# Altium integrated library Misc.IntLib: 123 symbols
Pins are listed as number, name and electrical type; pins without a type are passive.

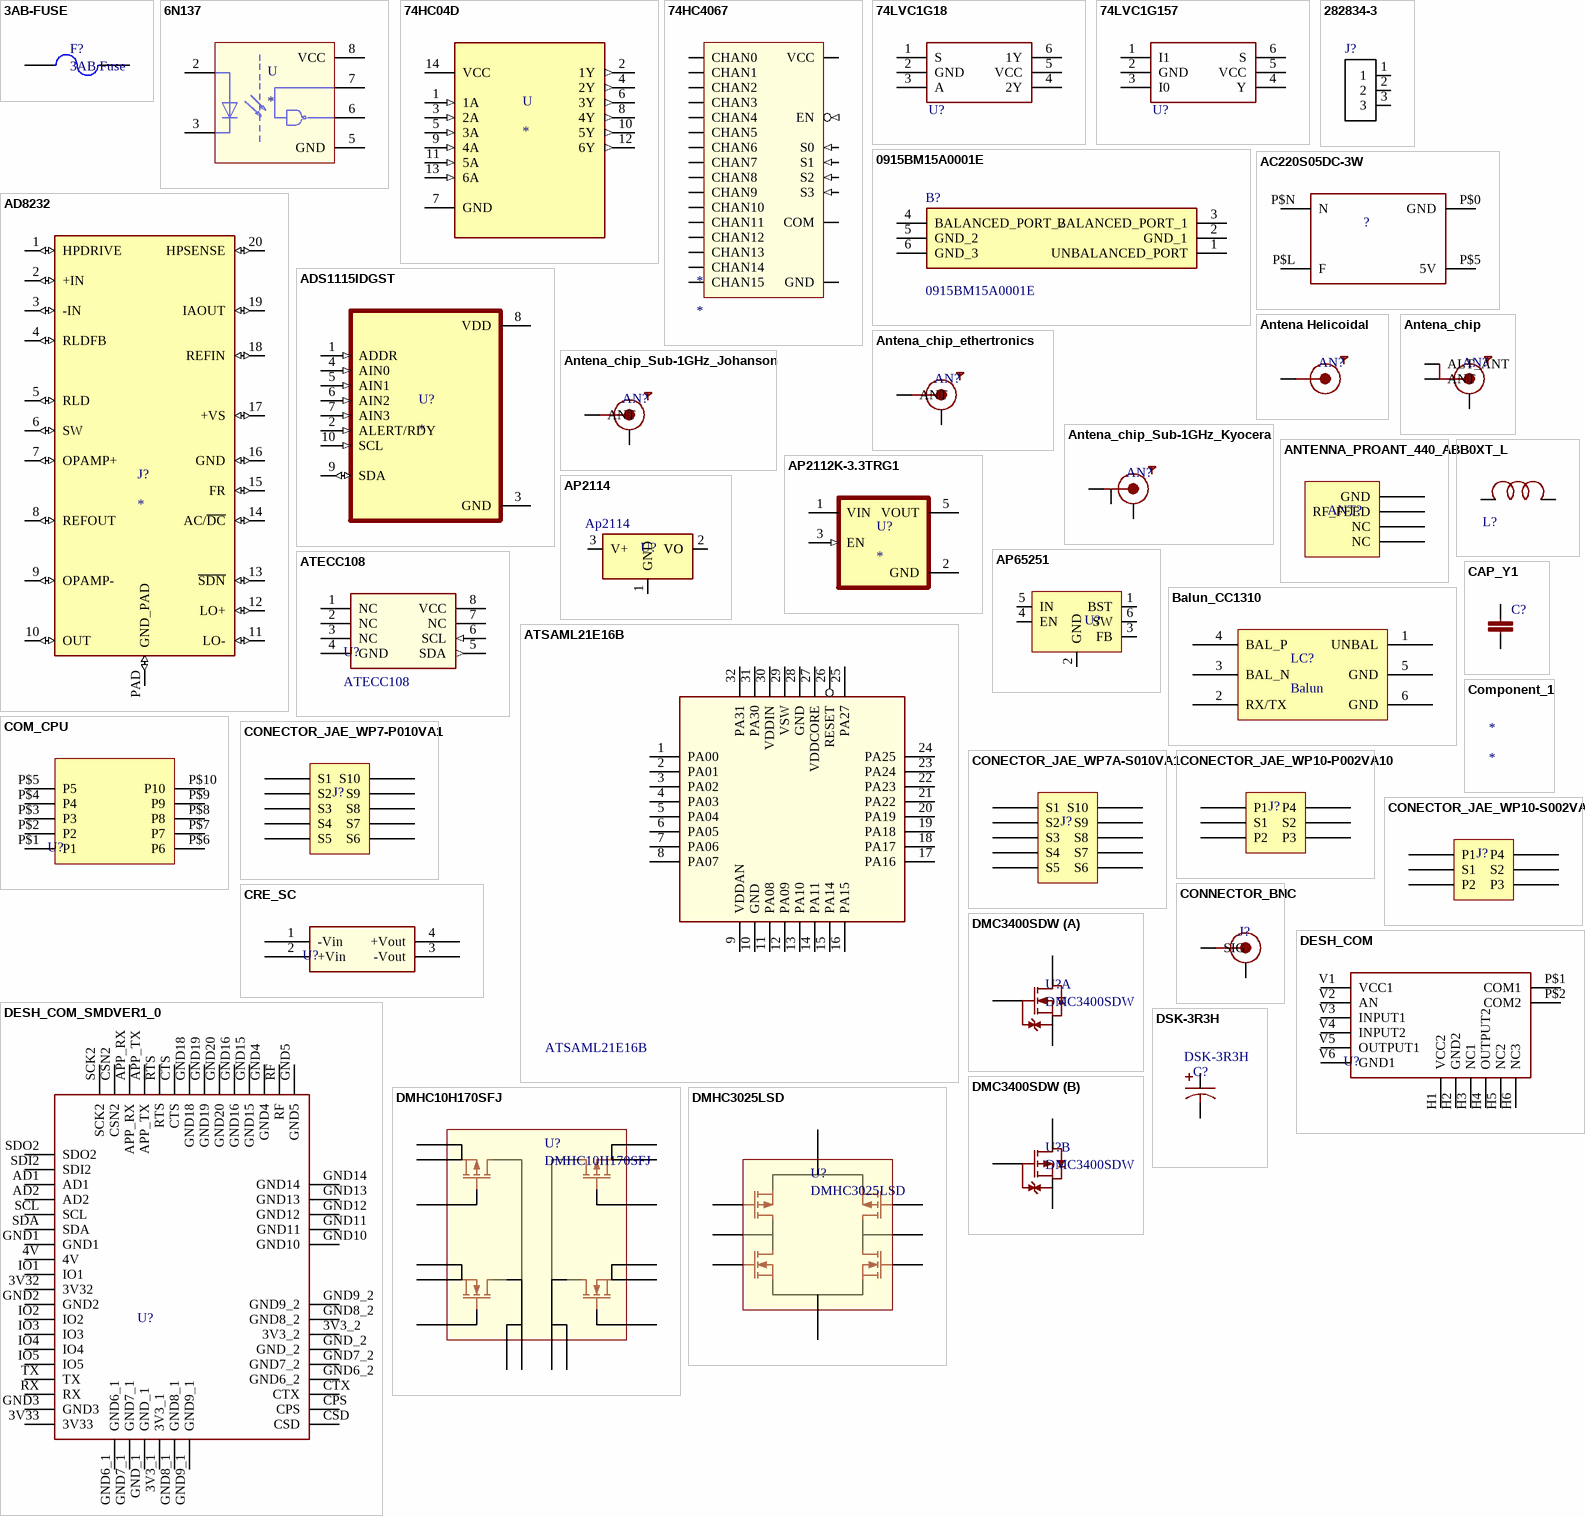
[diagram p0: symbols 3AB-FUSE to DSK-3R3H]

## 3AB-FUSE
designator F?, comment 3AB Fuse
footprint 3AB FUSE
pins: 1, 2

## 6N137
designator U
Optoaislador de salida lÃ³gica 10Mbps Open Collector 5000Vrms 1 Channel 5kV / Âµs CMTI 8-DIP; MP: 6N137; MF: Everlight Electronics; Availability: Unavailable; Package: DIP-8 Broadcom; Value: *; Price: None; SnapEDA_Link: https://www.snapeda.com/parts/6N137/Everlight%20Electronics%20Co%20Ltd/view-part/1771557/?ref=snap
footprint DIP8
pins: 2 A, 3 C, 5 GND (power), 6 VO, 7 VE, 8 VCC (power)

## 74HC04D
designator U
Inverter IC 6 Channel 14-SOIC; MP: 74HC04D; MF: Toshiba; Value: *; Package: SOIC-14 NXP Semiconductors; Price: None; Availability: Unavailable; SnapEDA_Link: https://www.snapeda.com/parts/74HC04D/Toshiba%20Semiconductor%20and%20Storage/view-part/1040011/?ref=snap
footprint SOIC14N
pins: 1 1A (in), 2 1Y (out), 3 2A (in), 4 2Y (out), 5 3A (in), 6 3Y (out), 7 GND, 8 4Y (out), 9 4A (in), 10 5Y (out), 11 5A (in), 12 6Y (out), 13 6A (in), 14 VCC (power)

## 74HC4067
designator *
footprint SOIC24
footprint DIP24
pins: 1 COM (io), 2 CHAN7 (io), 3 CHAN6 (io), 4 CHAN5 (io), 5 CHAN4 (io), 6 CHAN3 (io), 7 CHAN2 (io), 8 CHAN1 (io), 9 CHAN0 (io), 10 S0 (in), 11 S1 (in), 12 GND (io), 13 S3 (in), 14 S2 (in), 15 EN (in), 16 CHAN15 (io), 17 CHAN14 (io), 18 CHAN13 (io), 19 CHAN12 (io), 20 CHAN11 (io), 21 CHAN10 (io), 22 CHAN9 (io), 23 CHAN8 (io), 24 VCC (io)

## 74LVC1G18
designator U?
footprint SOT-353
pins: 1 S, 2 GND, 3 A, 4 2Y, 5 VCC, 6 1Y

## 74LVC1G157
designator U?
pins: 1 I1, 2 GND, 3 I0, 4 Y, 5 VCC, 6 S

## 0915BM15A0001E
designator B?
Signal Conditioning 915MHz BALUN/FILTER; Manufacturer_Name: JOHANSON TECHNOLOGY; Geometry.Height: 0.8mm; Mouser Part Number: 609-0915BM15A0001E; Mouser Price/Stock: https://www.mouser.co.uk/ProductDetail/Johanson-Technology/0915BM15A0001E?qs=yCnrNFeXz%252BhK%252B21mdTuojA%3D%3D; Manufacturer_Part_Number: 0915BM15A0001E; Datasheet Link: *
footprint 0915BM15A0001E
pins: 1 UNBALANCED_PORT, 2 GND_1, 3 BALANCED_PORT_1, 4 BALANCED_PORT_2, 5 GND_2, 6 GND_3

## 282834-3
designator J?  (value not drawn)
3 Position Wire to Board Terminal Block Horizontal with Board 0.100 _2.54mm_; MF: TE Connectivity; Package: None; SnapEDA_Link: https://www.snapeda.com/parts/282834-3/TE%20Connectivity%20AMP%20Connectors/view-part/?ref=snap; MP: 282834-3; Availability: Unavailable; TE_purchase_URL: https://www.te.com/usa-en/product-282834-3.html?te_bu=Cor&te_type=disp&te_campaign=seda_glo_cor-seda-global-disp-prtnr-fy19-seda-model-bom-cta_sma-317_1&elqCampaignId=32493; Price: None; EU_RoHS_Compliance: Compliant with Exemptions; Value: *
footprint TE_282834-3
pins: 1, 2, 3

## AC220S05DC-3W
designator ?
footprint HENLV
pins: P$0 GND, P$5 5V, P$L F, P$N N

## AD8232
designator J?
AD8232 Analog Front End Evaluation Board; MF: Analog Devices, Inc.; SnapEDA_Link: https://www.snapeda.com/parts/AD8232/Analog+Devices/view-part/?ref=snap; Package: None; Value: *; MP: AD8232; Check_prices: https://www.snapeda.com/parts/AD8232/Analog+Devices/view-part/?ref=eda
footprint LFCSP_20
pins: 1 HPDRIVE (io), 2 +IN (io), 3 -IN (io), 4 RLDFB (io), 5 RLD (io), 6 SW (io), 7 OPAMP+ (io), 8 REFOUT (io), 9 OPAMP- (io), 10 OUT (io), 11 LO- (io), 12 LO+ (io), 13 ~{SDN} (io), 14 AC/~{DC} (io), 15 FR (io), 16 GND (io), 17 +VS (io), 18 REFIN (io), 19 IAOUT (io), 20 HPSENSE (io), PAD GND_PAD (io)

## ADS1115IDGST
designator U?
MP: ADS1115IDGST; Value: *; Price: None; Package: None; Availability: Unavailable
footprint SOP50P490X110-10N
pins: 1 ADDR (in), 2 ALERT/RDY (in), 3 GND (power), 4 AIN0 (in), 5 AIN1 (in), 6 AIN2 (in), 7 AIN3 (in), 8 VDD (power), 9 SDA (io), 10 SCL (in)

## Antena Helicoidal
designator AN?, comment Antenna  (value not drawn)
antenna helicoidal Sub-1GHZ; Value: 915MHz
footprint Antena Sub-1GHz horizon
footprint Antena Sub-1GHz vertical
footprint Antena Sub-1GHz horizon - Longo
pins: 1 ANT

## Antena_chip
designator AN?, comment Antenna Chip  (value not drawn)
Molex antenna chip for 2.4GHZ; Part Number: 2030060001; Value: 2.4GHz; Vendor: Molex
footprint Antenna_molex_203 (Wi-Fi-ready MID Chip  and Ceramic SMT Antennas)
pins: 1 ALT_ANT, 2 ANT, 3 GND (power)

## Antena_chip_ethertronics
designator AN?, comment Antenna Chip  (value not drawn)
Molex antenna chip for 2.4GHZ; Part Number: M310220; Vendor: Ethertronics; Value: 2.4GHz
footprint Antena_ethertronics_M310220 (Antena chip Ethertronics BT e wifi)
pins: 1 ANT, 2 GND (power)

## Antena_chip_Sub-1GHz_Johanson
designator AN?, comment Antenna Chip  (value not drawn)
Antennas 915MHz ANTENNA; Part Number: 0915AT43A0026E; Vendor: Johanson Technology; Value: 915MHz
footprint Antenna_Johanson_0915AT43 (Antennas 915MHz ANTENNA)
pins: 1 ANT, 2 GND

## Antena_chip_Sub-1GHz_Kyocera
designator AN?, comment Antenna Chip  (value not drawn)
Antennas Ceramic Chip ANTENNA ISM Freq: 868 915MHz; Part Number: M620720; Value: Sub-1GHz; Vendor: AVX; Família: Antena
footprint Antena_ethertronics_M620720 (Antena chip Ethertronics Sub-1GHz)
pins: 1 FEED, 2 DUMMY, 3 GND (power)

## ANTENNA_PROANT_440_AB
designator ANT?
Small antenna for embedded products on the 2.4GHz ISM band, suitable for applications in  WLAN/Wifi, Bluetooth, Zigbee, RFID, WirelessHART etc.; Part Number: PRO-OB-440; Vendor: Proant; Value: *
footprint ANTENNA_PROANT_440_AB (Small antenna for embedded products on the 2.4GHz ISM band, suitable for applications in  WLAN/Wifi, Bluetooth, Zigbee, RFID, WirelessHART etc.)
pins: 1 GND, 2 RF_FEED, 3 NC, 4 NC

## AP2112K-3.3TRG1
designator U?
Linear Voltage Regulator IC Positive Fixed 1 Output 600mA SOT-25; MF: Diodes Inc.; MP: AP2112K-3.3TRG1; Value: *; Purchase-URL: https://pricing.snapeda.com/search/part/AP2112K-3.3TRG1/?ref=eda; Package: SOT-753 Diodes Inc.; Availability: In Stock; Check_prices: https://www.snapeda.com/parts/AP2112K-3.3TRG1/Diodes+Inc./view-part/?ref=eda; Price: None; SnapEDA_Link: https://www.snapeda.com/parts/AP2112K-3.3TRG1/Diodes+Inc./view-part/?ref=snap
footprint SOT95P285X140-5N
pins: 1 VIN (power), 2 GND (power), 3 EN (in), 5 VOUT (power)

## AP2114
designator U?
Vendor: Diodes Incorporated; Part Number: Ap2114
footprint SOT223 (SOT223, 4-Leads)
pins: 1 GND (power), 2 VO, 3 V+ (power), 4 VO

## AP65251
designator U?  (value not drawn)
Part Number: AP65251WU-7; Vendor: Diodes Inc.
footprint DBV0006A_N
pins: 1 BST (power), 2 GND, 3 FB, 4 EN, 5 IN, 6 SW

## ATECC108
designator U?
Atmel CryptoAuthentication Device; Part Number: ATMEL ATECC108; Value: ATECC108
footprint UDFN8 (UDFN8 2x3, 0.65P  CASE 517BF)
pins: 1 NC, 2 NC, 3 NC, 4 GND (power), 5 SDA (out), 6 SCL (in), 7 NC, 8 VCC (power)

## ATSAML21E16B
designator U?
Ultra low-power microcontroller using the 32-bit ARM Cortex- M0+ processor at max; Vendor: Microchip; Part Number: ATSAML21E16B
footprint TQFP32
pins: 1 PA00, 2 PA01, 3 PA02, 4 PA03, 5 PA04, 6 PA05, 7 PA06, 8 PA07, 9 VDDAN, 10 GND, 11 PA08, 12 PA09, 13 PA10, 14 PA11, 15 PA14, 16 PA15, 17 PA16, 18 PA17, 19 PA18, 20 PA19, 21 PA22, 22 PA23, 23 PA24, 24 PA25, 25 PA27, 26 RESET, 27 VDDCORE, 28 GND, 29 VSW, 30 VDDIN, 31 PA30, 32 PA31

## B0XT_L
designator L?
footprint IND_B0X
pins: P$1 P1, P$2 P2

## Balun_CC1310
designator LC?, comment Balun
Sub-GHz Impedance Matched Balun + LPF integrated Passive Component for Texas Instruments CC1310 Chipset; Part Number: 0850BM14E0016; Vendor: Johanson Technology; Value: *
footprint Balun_0603 (SMD Balun 0603)
pins: 1 UNBAL, 2 RX/TX, 3 BAL_N, 4 BAL_P, 5 GND, 6 GND

## CAP_Y1
designator C?
footprint Y1
pins: 1, 2

## COM_CPU
designator U?
footprint COM_CPU
pins: P$1 P1, P$2 P2, P$3 P3, P$4 P4, P$5 P5, P$6 P6, P$7 P7, P$8 P8, P$9 P9, P$10 P10

## Component_1
designator *

## CONECTOR_JAE_WP7-P010VA1
designator J?
WP7-P010VA1 - plug - (10 signal); Part Number: WP7-P010VA1-R8000; Value: *; Vendor: *
footprint WP7-P010VA1
pins: 1 S1, 2 S2, 3 S3, 4 S4, 5 S5, 6 S6, 7 S7, 8 S8, 9 S9, 10 S10

## CONECTOR_JAE_WP7A-S010VA1
designator J?
WP7A-S010VA1 - recpt. - (10 signal); Part Number: WP7A-S010VA1-R8000; Value: *; Vendor: *
footprint WP7A-S010VA1
pins: 1 S1, 2 S2, 3 S3, 4 S4, 5 S5, 6 S6, 7 S7, 8 S8, 9 S9, 10 S10

## CONECTOR_JAE_WP10-P002VA10
designator J?
WP10-P002VA10 - plug - (2 signal + 4 power); Part Number: WP10-P002VA10-R15000; Value: *; Vendor: *
footprint WP10-P002VA10
pins: 1 P1, 2 S1, 3 P2, 4 P3, 5 S2, 6 P4

## CONECTOR_JAE_WP10-S002VA10
designator J?
WP10-S002VA10 - recpt. - (2 signal + 4 power); Part Number: WP10-S002VA10-R15000; Value: *; Vendor: *
footprint WP10-S002VA10
pins: 1 P1, 2 S1, 3 P2, 4 P3, 5 S2, 6 P4

## CONNECTOR_BNC
designator J?
footprint CONNECTOR_BNC
pins: 1 SIG, 2 GND (power)

## CRE_SC
designator U?  (value not drawn)
footprint CRE1-SC (DC_DC isolated converter)
pins: 1 -Vin, 2 +Vin, 3 -Vout, 4 +Vout

## DESH_COM
designator U?
footprint DESH_COM
pins: H1 VCC2 (power), H2 GND2, H3 NC1, H4 OUTPUT2, H5 NC2, H6 NC3, P$1 COM1, P$2 COM2, V1 VCC1 (power), V2 AN, V3 INPUT1, V4 INPUT2, V5 OUTPUT1, V6 GND1

## DESH_COM_SMDVER1_0
designator U?  (value not drawn)
footprint DESH_COM_SMD
pins: 3V3_1, 3V3_2, 3V32, 3V33, 4V, AD1, AD2, APP_RX, APP_TX, CPS, CSD, CSN2, CTS, CTX, GND1, GND2, GND3, GND4, GND5, GND6_1, GND6_2, GND7_1, GND7_2, GND8_1, GND8_2, GND9_1, GND9_2, GND10, GND11, GND12, GND13, GND14, GND15, GND16, GND18, GND19, GND20, GND_1, GND_2, IO1, IO2, IO3, IO4, IO5, RF, RTS, RX, SCK2, SCL, SDA, SDI2, SDO2, TX

## DMC3400SDW
designator U?
COMPLEMENTARY PAIR ENHANCEMENT MODE MOSFET; Part Number: DMC3400SDW-13; Vendor: Diodes Incorporated
footprint SOT363
part A pins: 1 S1, 2 G1, 6 D1
part B pins: 3 D2, 4 S2, 5 G2

## DMHC10H170SFJ
designator U?
100V COMPLEMENTARY ENHANCEMENT MODE MOSFET H-BRIDGE; Vendor: Diodes Incorporated
pins: 1 G1, 2 S1, 3 S1, 4 G2, 5 S2, 6 S2, 7 S3, 8 S3, 9 G3, 10 S4, 11 S4, 12 G4, B1 D1_2, B2 D1_2, B3 D3_4, B4 D3_4

## DMHC3025LSD
designator U?
30V COMPLEMENTARY ENHANCEMENT MODE MOSFET H-BRIDGE; Vendor: Diodes Incorporated; Part Number: DMHC3025LSD
footprint SO08-MEDIUM
pins: 1 N1G, 2 N1D/P1D, 3 N1S/N2S, 4 N2G, 5 P2G, 6 N2D/P2D, 7 P1S/P2S, 8 P1G

## DSK-3R3H
designator C?  Part Number: DSK-3R3H
Coin Cell Capacitors, Elne; Vendor: Elna; Família: Capacitor
footprint DSK-3R3H204T614-H2L
pins: 1 +, 2 -

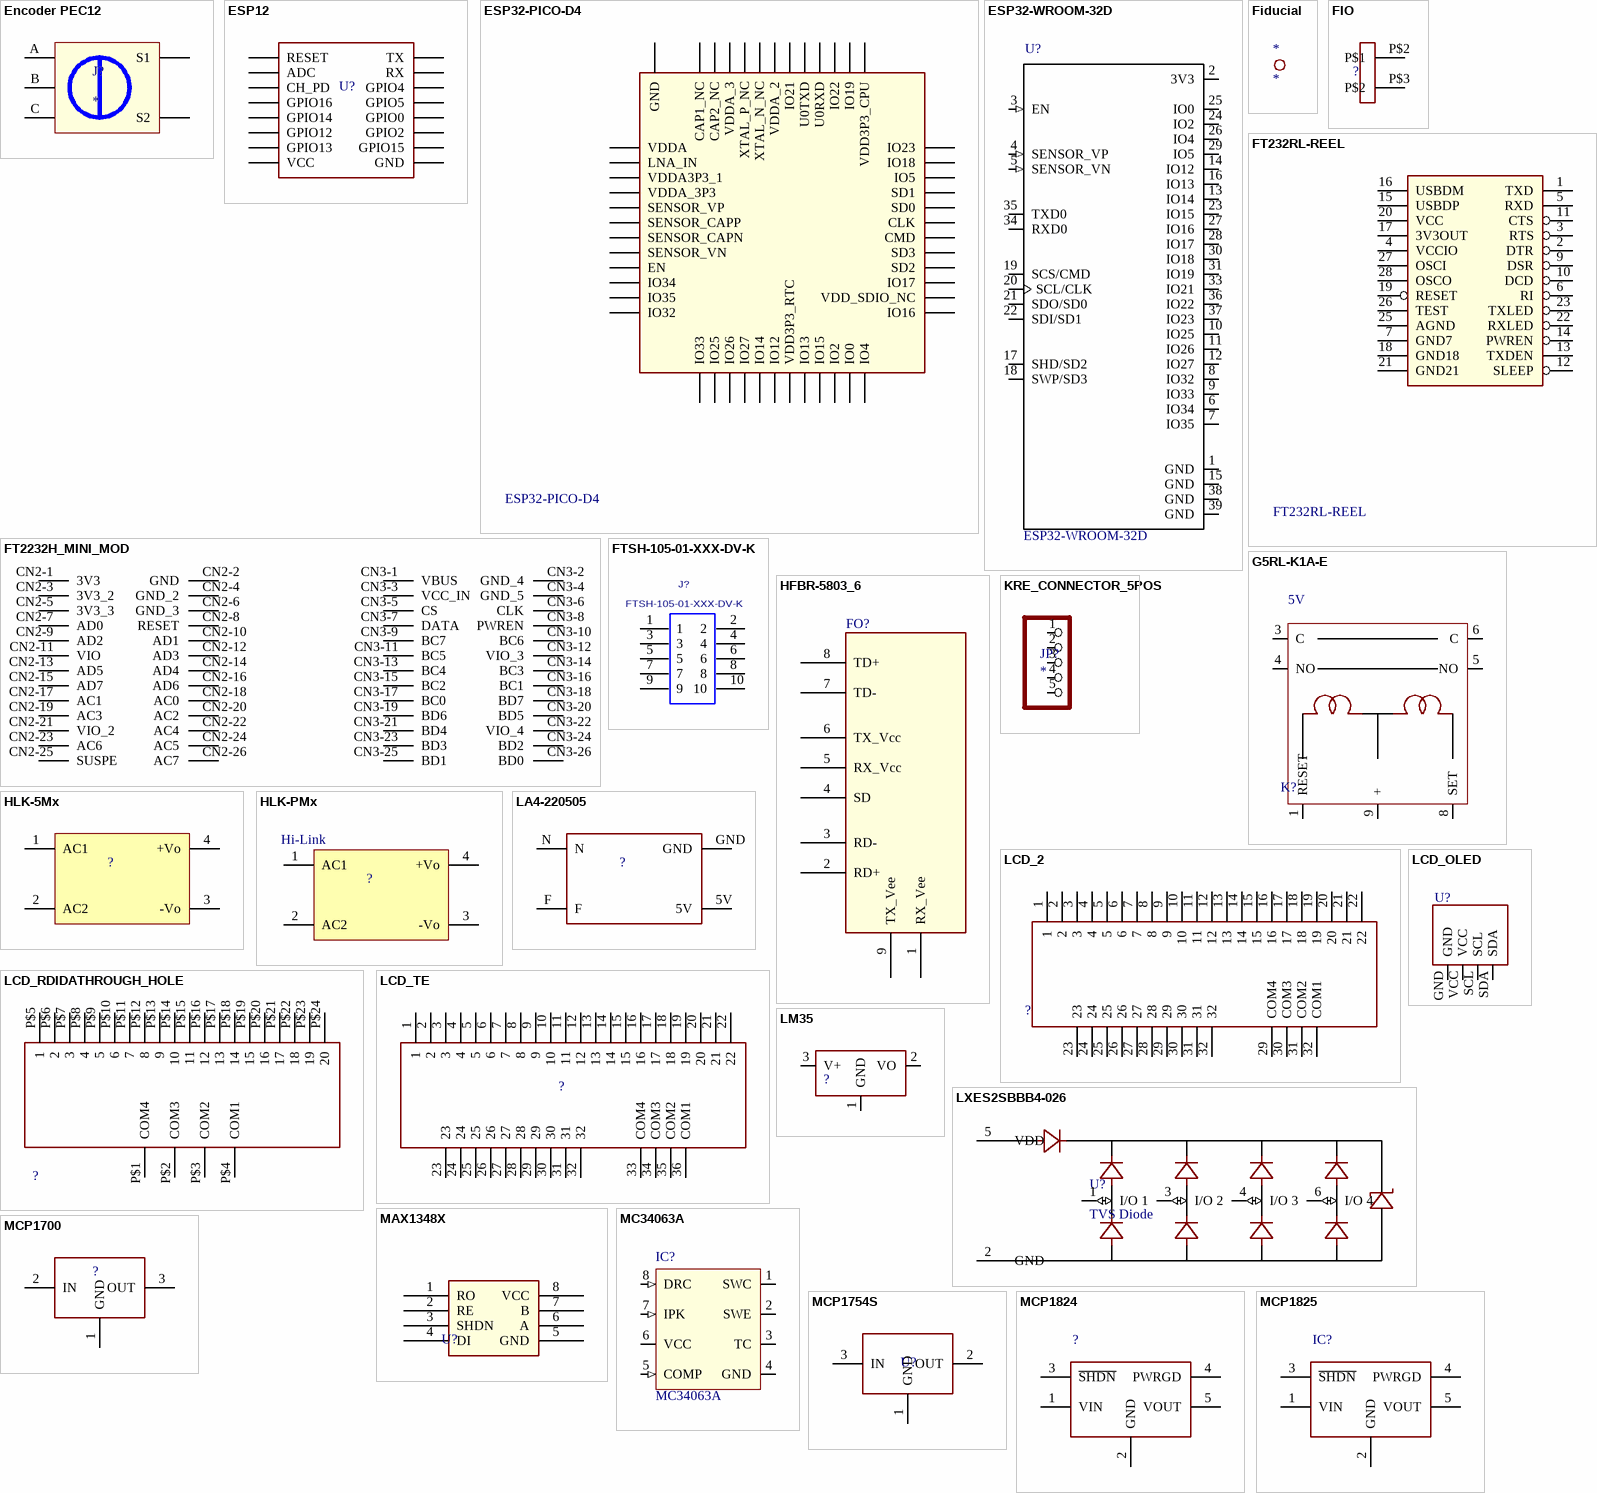
[diagram p1: symbols Encoder PEC12 to MCP1825]

## Encoder PEC12
designator J?
PEC12R-3217F-S0024
pins: 1 S1, 2 S2, A, B, C

## ESP12
designator U?  (value not drawn)
Part Number: ESP12; Vendor: AI Thinjer
footprint ESP12 (Wifi module ESP12)
pins: ADC, CH_PD, GND, GPIO0, GPIO2, GPIO4, GPIO5, GPIO12, GPIO13, GPIO14, GPIO15, GPIO16, RESET, RXD0 RX, TXD0 TX, VCC

## ESP32-PICO-D4
designator U?
System-in-Package (SIP) module based on ESP32; Vendor: Espressif; Part Number: ESP32-PICO-D4; Value: *
footprint QFN48-7x7
pins: 1 VDDA, 2 LNA_IN, 3 VDDA3P3_1, 4 VDDA_3P3, 5 SENSOR_VP, 6 SENSOR_CAPP, 7 SENSOR_CAPN (power), 8 SENSOR_VN, 9 EN, 10 IO34, 11 IO35, 12 IO32, 13 IO33, 14 IO25, 15 IO26, 16 IO27, 17 IO14, 18 IO12 (power), 19 VDD3P3_RTC, 20 IO13, 21 IO15, 22 IO2, 23 IO0, 24 IO4, 25 IO16, 26 VDD_SDIO_NC, 27 IO17, 28 SD2, 29 SD3, 30 CMD, 31 CLK, 32 SD0, 33 SD1, 34 IO5, 35 IO18, 36 IO23, 37 VDD3P3_CPU, 38 IO19, 39 IO22, 40 U0RXD, 41 U0TXD, 42 IO21 (power), 43 VDDA_2, 44 XTAL_N_NC, 45 XTAL_P_NC, 46 VDDA_3, 47 CAP2_NC, 48 CAP1_NC, 49 GND

## ESP32-WROOM-32D
designator U?
ESP32 Module; MF: Espressif Systems; MP: ESP32-WROOM-32D; SnapEDA_Link: https://www.snapeda.com/parts/ESP32-WROOM-32D/Espressif%20Systems/view-part/?ref=snap; Package: Module Espressif Systems; Digi-Key_Part_Number: 1904-1023-1-ND; Digi-Key_Purchase_URL: https://www.digikey.com/product-detail/en/espressif-systems/ESP32-WROOM-32D/1904-1023-1-ND/9381732?utm_source=snapeda&utm_medium=aggregator&utm_campaign=symbol; Value: *
footprint ESP32-WROOM-32D
pins: 1 GND (power), 2 3V3 (power), 3 EN (in), 4 SENSOR_VP (in), 5 SENSOR_VN (in), 6 IO34 (io), 7 IO35 (io), 8 IO32 (io), 9 IO33 (io), 10 IO25 (io), 11 IO26 (io), 12 IO27 (io), 13 IO14 (io), 14 IO12 (io), 15 GND (power), 16 IO13 (io), 17 SHD/SD2 (io), 18 SWP/SD3 (io), 19 SCS/CMD (io), 20 SCL/CLK (io), 21 SDO/SD0 (io), 22 SDI/SD1 (io), 23 IO15 (io), 24 IO2 (io), 25 IO0 (io), 26 IO4 (io), 27 IO16 (io), 28 IO17 (io), 29 IO5 (io), 30 IO18 (io), 31 IO19 (io), 33 IO21 (io), 34 RXD0 (io), 35 TXD0 (io), 36 IO22 (io), 37 IO23 (io), 38 GND (power), 39 GND (power)

## Fiducial
designator *
footprint Fiducial

## FIO
designator ?
footprint CONECTORFIO
pins: P$2 P$1, P$3 P$2

## FT232RL-REEL
designator U?
USB Interface IC USB to Serial UART Enhanced IC SSOP-28; Vendor: FTDI Chip; Part Number: FT232RL-REEL; Value: *
footprint FT232R
pins: 1 TXD, 2 DTR, 3 RTS, 4 VCCIO, 5 RXD, 6 RI, 7 GND7, 9 DSR, 10 DCD, 11 CTS, 12 SLEEP, 13 TXDEN, 14 PWREN, 15 USBDP, 16 USBDM, 17 3V3OUT, 18 GND18, 19 RESET, 20 VCC, 21 GND21, 22 RXLED, 23 TXLED, 25 AGND, 26 TEST, 27 OSCI, 28 OSCO

## FT2232H_MINI_MOD
designator U?  (value not drawn)
footprint FT2232_MOD
pins: CN2-1 3V3, CN2-2 GND, CN2-3 3V3_2, CN2-4 GND_2, CN2-5 3V3_3, CN2-6 GND_3, CN2-7 AD0, CN2-8 RESET, CN2-9 AD2, CN2-10 AD1, CN2-11 VIO, CN2-12 AD3, CN2-13 AD5, CN2-14 AD4, CN2-15 AD7, CN2-16 AD6, CN2-17 AC1, CN2-18 AC0, CN2-19 AC3, CN2-20 AC2, CN2-21 VIO_2, CN2-22 AC4, CN2-23 AC6, CN2-24 AC5, CN2-25 SUSPE, CN2-26 AC7, CN3-1 VBUS, CN3-2 GND_4, CN3-3 VCC_IN, CN3-4 GND_5, CN3-5 CS, CN3-6 CLK, CN3-7 DATA, CN3-8 PWREN, CN3-9 BC7, CN3-10 BC6, CN3-11 BC5, CN3-12 VIO_3, CN3-13 BC4, CN3-14 BC3, CN3-15 BC2, CN3-16 BC1, CN3-17 BC0, CN3-18 BD7, CN3-19 BD6, CN3-20 BD5, CN3-21 BD4, CN3-22 VIO_4, CN3-23 BD3, CN3-24 BD2, CN3-25 BD1, CN3-26 BD0

## FTSH-105-01-XXX-DV-K
designator J?
TERMINAL STRIP, .050"(1.27mm) PITCH, 10 PINS, KEYED
footprint FTSH-105-01-XXX-DV-K
pins: 1, 2, 3, 4, 5, 6, 7, 8, 9, 10

## G5RL-K1A-E
designator K?  value 5V
Part Number: G5RL-K1A-E
footprint OnROM RELAY LATCH 1 NO
pins: 1 RESET, 3 C, 4 NO, 5 NO, 6 C, 8 SET, 9 +

## HFBR-5803_6
designator FO?, comment AVAGO_AFBR-5803Z  (value not drawn)
FDDI, 100 Mb/s ATM, and Fast Ethernet Transceivers; Part Number: AFBR-580xxTZ; Vendor: AVAGO
footprint AVAGO_AFBR-5803Z
pins: 1 RX_Vee, 2 RD+, 3 RD-, 4 SD, 5 RX_Vcc, 6 TX_Vcc, 7 TD-, 8 TD+, 9 TX_Vee

## HLK-5Mx
designator ?  (value not drawn)
5W Power Module
footprint HLK-5MX (5W power supply)
pins: 1 AC1, 2 AC2, 3 -Vo, 4 +Vo

## HLK-PMx
designator ?  Vendor: Hi-Link  (hidden comment: HLK-PMx)
3W Power Module
footprint HLK-PMX (3W power supply)
pins: 1 AC1, 2 AC2, 3 -Vo, 4 +Vo

## KRE_CONNECTOR_5POS
designator JP?
footprint KRE_CONNECTOR_5POS (KRE Connector 5pos 1kV)
pins: 1, 2, 3, 4, 5

## LA4-220505
designator ?
footprint LA4
pins: 5V, F, GND, N

## LCD_2
designator ?
footprint LCD_2
pins: 1, 2, 3, 4, 5, 6, 7, 8, 9, 10, 11, 12, 13, 14, 15, 16, 17, 18, 19, 20, 21, 22, 23, 24, 25, 26, 27, 28, 29 COM4, 29, 30 COM3, 30, 31 COM2, 31, 32 COM1, 32

## LCD_OLED
designator U?
footprint 096_OLED
pins: GND, SCL, SDA, VCC

## LCD_RDIDATHROUGH_HOLE
designator ?
footprint LCD_RDIDA
pins: P$1 COM4, P$2 COM3, P$3 COM2, P$4 COM1, P$5 1, P$6 2, P$7 3, P$8 4, P$9 5, P$10 6, P$11 7, P$12 8, P$13 9, P$14 10, P$15 11, P$16 12, P$17 13, P$18 14, P$19 15, P$20 16, P$21 17, P$22 18, P$23 19, P$24 20